# Altium footprint library module.PcbLib: 3 footprints
Each footprint in its own frame and in the unit in brackets; x right, y up, seen from the top. Pads: shape width x height; smd on the part's side, far side on the other; paste and mask are expansions set on the pad; w line width, h text height; cw(c..) or ccw(c..) is an arc to the next point about the centre after c.
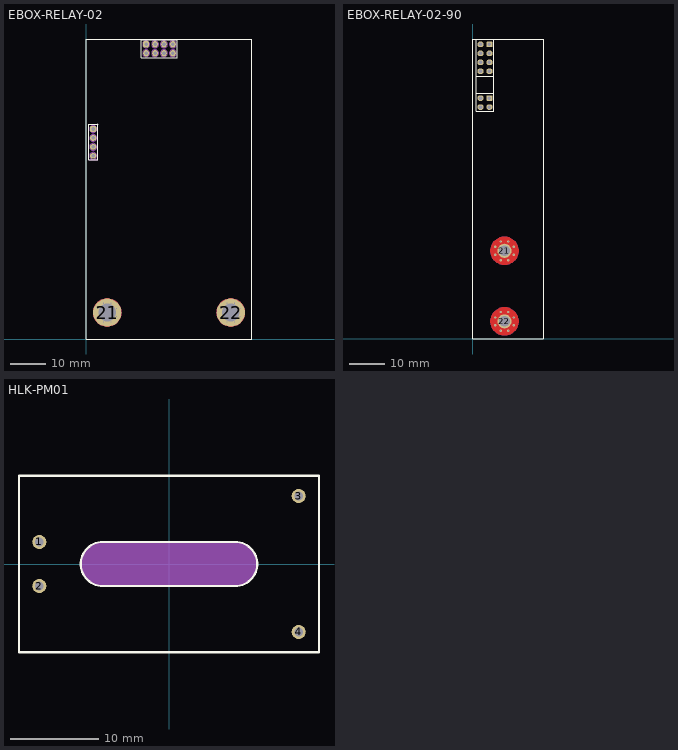
[diagram p0: the footprints below, top view; thin cyan lines are the x and y axes]

## EBOX-RELAY-02 [mm]
pads (14):
  rrect50% 1.6x1.8 hole 1: 1(17,83.5)
  oval 1.6x1.8 hole 1: 2(17,80.96) 3(19.54,83.5) 4(19.54,80.96) 5(22.08,83.5) 6(22.08,80.96) 7(24.62,83.5) 8(24.62,80.96)
  rrect50% 1.8x1.6 hole 1: 11(2,59.5)
  oval 1.8x1.6 hole 1: 12(2,56.96) 13(2,54.42) 14(2,51.88)
  round 8 hole 5: 21(6,7.5) 22(41,7.5)
via 7.1,4.85 diameter 0.66 hole 0.33
via 3.35,6.4 diameter 0.66 hole 0.33
via 4.9,10.15 diameter 0.66 hole 0.33
via 8.65,8.6 diameter 0.66 hole 0.33
via 3.35,8.6 diameter 0.66 hole 0.33
via 7.1,10.15 diameter 0.66 hole 0.33
via 8.65,6.4 diameter 0.66 hole 0.33
via 4.9,4.85 diameter 0.66 hole 0.33
via 42.1,4.85 diameter 0.66 hole 0.33
via 38.35,6.4 diameter 0.66 hole 0.33
via 39.9,10.15 diameter 0.66 hole 0.33
via 43.65,8.6 diameter 0.66 hole 0.33
via 38.35,8.6 diameter 0.66 hole 0.33
via 42.1,10.15 diameter 0.66 hole 0.33
via 43.65,6.4 diameter 0.66 hole 0.33
via 39.9,4.85 diameter 0.66 hole 0.33
Top Layer:
  region: 3.75,7.6 3.775,7.825 3.825,8.075 3.9,8.3 3.975,8.475 4.05,8.625 4.125,8.75 4.225,8.875 4.325,9 3.4,9.925 3.225,9.725 3.075,9.525 2.95,9.325 2.825,9.1 2.725,8.875 2.65,8.675 2.575,8.45 2.525,8.225 2.5,8.1 2.475,7.95 2.45,7.6
  region: 3.75,7.4 3.775,7.175 3.825,6.925 3.9,6.7 3.975,6.525 4.05,6.375 4.125,6.25 4.225,6.125 4.325,6 3.4,5.075 3.225,5.275 3.075,5.475 2.95,5.675 2.825,5.9 2.725,6.125 2.65,6.325 2.575,6.55 2.525,6.775 2.5,6.9 2.475,7.05 2.45,7.4
  region: 5.9,9.75 5.675,9.725 5.425,9.675 5.2,9.6 5.025,9.525 4.875,9.45 4.75,9.375 4.625,9.275 4.5,9.175 3.575,10.1 3.775,10.275 3.975,10.425 4.175,10.55 4.4,10.675 4.625,10.775 4.825,10.85 5.05,10.925 5.275,10.975 5.4,11 5.55,11.025 5.9,11.05
  region: 6.1,9.75 6.325,9.725 6.575,9.675 6.8,9.6 6.975,9.525 7.125,9.45 7.25,9.375 7.375,9.275 7.5,9.175 8.425,10.1 8.225,10.275 8.025,10.425 7.825,10.55 7.6,10.675 7.375,10.775 7.175,10.85 6.95,10.925 6.725,10.975 6.6,11 6.45,11.025 6.1,11.05
  region: 8.25,7.4 8.225,7.175 8.175,6.925 8.1,6.7 8.025,6.525 7.95,6.375 7.875,6.25 7.775,6.125 7.675,6 8.6,5.075 8.775,5.275 8.925,5.475 9.05,5.675 9.175,5.9 9.275,6.125 9.35,6.325 9.425,6.55 9.475,6.775 9.5,6.9 9.525,7.05 9.55,7.4
  region: 8.25,7.6 8.225,7.825 8.175,8.075 8.1,8.3 8.025,8.475 7.95,8.625 7.875,8.75 7.775,8.875 7.675,9 8.6,9.925 8.775,9.725 8.925,9.525 9.05,9.325 9.175,9.1 9.275,8.875 9.35,8.675 9.425,8.45 9.475,8.225 9.5,8.1 9.525,7.95 9.55,7.6
  region: 6.1,5.25 6.325,5.275 6.575,5.325 6.8,5.4 6.975,5.475 7.125,5.55 7.25,5.625 7.375,5.725 7.5,5.825 8.425,4.9 8.225,4.725 8.025,4.575 7.825,4.45 7.6,4.325 7.375,4.225 7.175,4.15 6.95,4.075 6.725,4.025 6.6,4 6.45,3.975 6.1,3.95
  region: 5.9,5.25 5.675,5.275 5.425,5.325 5.2,5.4 5.025,5.475 4.875,5.55 4.75,5.625 4.625,5.725 4.5,5.825 3.575,4.9 3.775,4.725 3.975,4.575 4.175,4.45 4.4,4.325 4.625,4.225 4.825,4.15 5.05,4.075 5.275,4.025 5.4,4 5.55,3.975 5.9,3.95
  pour cut-out: 2,7.5 2,7.762 2.068,8.282 2.204,8.789 2.405,9.273 2.667,9.727 2.986,10.143 3.357,10.514 3.773,10.833 4.227,11.095 4.711,11.296 5.218,11.431 5.738,11.5 6,11.5 6.262,11.5 6.782,11.432 7.288,11.296 7.773,11.095 8.227,10.833 8.643,10.514 9.014,10.143 9.333,9.727 9.595,9.273 9.796,8.788 9.932,8.282 10,7.762 10,7.5 10,7.238 9.932,6.718 9.796,6.211 9.595,5.727 9.333,5.273 9.014,4.857 8.643,4.486 8.227,4.167 7.773,3.905 7.289,3.704 6.782,3.568 6.262,3.5 6,3.5 5.738,3.5 5.218,3.568 4.712,3.704 4.227,3.905 3.773,4.167 3.357,4.486 2.986,4.857 2.667,5.273 2.405,5.727 2.204,6.211 2.068,6.718 2,7.238
  region: 38.75,7.6 38.775,7.825 38.825,8.075 38.9,8.3 38.975,8.475 39.05,8.625 39.125,8.75 39.225,8.875 39.325,9 38.4,9.925 38.225,9.725 38.075,9.525 37.95,9.325 37.825,9.1 37.725,8.875 37.65,8.675 37.575,8.45 37.525,8.225 37.5,8.1 37.475,7.95 37.45,7.6
  region: 38.75,7.4 38.775,7.175 38.825,6.925 38.9,6.7 38.975,6.525 39.05,6.375 39.125,6.25 39.225,6.125 39.325,6 38.4,5.075 38.225,5.275 38.075,5.475 37.95,5.675 37.825,5.9 37.725,6.125 37.65,6.325 37.575,6.55 37.525,6.775 37.5,6.9 37.475,7.05 37.45,7.4
  region: 40.9,9.75 40.675,9.725 40.425,9.675 40.2,9.6 40.025,9.525 39.875,9.45 39.75,9.375 39.625,9.275 39.5,9.175 38.575,10.1 38.775,10.275 38.975,10.425 39.175,10.55 39.4,10.675 39.625,10.775 39.825,10.85 40.05,10.925 40.275,10.975 40.4,11 40.55,11.025 40.9,11.05
  region: 41.1,9.75 41.325,9.725 41.575,9.675 41.8,9.6 41.975,9.525 42.125,9.45 42.25,9.375 42.375,9.275 42.5,9.175 43.425,10.1 43.225,10.275 43.025,10.425 42.825,10.55 42.6,10.675 42.375,10.775 42.175,10.85 41.95,10.925 41.725,10.975 41.6,11 41.45,11.025 41.1,11.05
  region: 43.25,7.4 43.225,7.175 43.175,6.925 43.1,6.7 43.025,6.525 42.95,6.375 42.875,6.25 42.775,6.125 42.675,6 43.6,5.075 43.775,5.275 43.925,5.475 44.05,5.675 44.175,5.9 44.275,6.125 44.35,6.325 44.425,6.55 44.475,6.775 44.5,6.9 44.525,7.05 44.55,7.4
  region: 43.25,7.6 43.225,7.825 43.175,8.075 43.1,8.3 43.025,8.475 42.95,8.625 42.875,8.75 42.775,8.875 42.675,9 43.6,9.925 43.775,9.725 43.925,9.525 44.05,9.325 44.175,9.1 44.275,8.875 44.35,8.675 44.425,8.45 44.475,8.225 44.5,8.1 44.525,7.95 44.55,7.6
  region: 41.1,5.25 41.325,5.275 41.575,5.325 41.8,5.4 41.975,5.475 42.125,5.55 42.25,5.625 42.375,5.725 42.5,5.825 43.425,4.9 43.225,4.725 43.025,4.575 42.825,4.45 42.6,4.325 42.375,4.225 42.175,4.15 41.95,4.075 41.725,4.025 41.6,4 41.45,3.975 41.1,3.95
  region: 40.9,5.25 40.675,5.275 40.425,5.325 40.2,5.4 40.025,5.475 39.875,5.55 39.75,5.625 39.625,5.725 39.5,5.825 38.575,4.9 38.775,4.725 38.975,4.575 39.175,4.45 39.4,4.325 39.625,4.225 39.825,4.15 40.05,4.075 40.275,4.025 40.4,4 40.55,3.975 40.9,3.95
  pour cut-out: 37,7.5 37,7.762 37.068,8.282 37.204,8.789 37.405,9.273 37.667,9.727 37.986,10.143 38.357,10.514 38.773,10.833 39.227,11.095 39.711,11.296 40.218,11.431 40.738,11.5 41,11.5 41.262,11.5 41.782,11.432 42.288,11.296 42.773,11.095 43.227,10.833 43.643,10.514 44.014,10.143 44.333,9.727 44.595,9.273 44.796,8.788 44.932,8.282 45,7.762 45,7.5 45,7.238 44.932,6.718 44.796,6.211 44.595,5.727 44.333,5.273 44.014,4.857 43.643,4.486 43.227,4.167 42.773,3.905 42.289,3.704 41.782,3.568 41.262,3.5 41,3.5 40.738,3.5 40.218,3.568 39.712,3.704 39.227,3.905 38.773,4.167 38.357,4.486 37.986,4.857 37.667,5.273 37.405,5.727 37.204,6.211 37.068,6.718 37,7.238
Bottom Layer:
  pour cut-out: 2,7.5 2,7.762 2.068,8.282 2.204,8.789 2.405,9.273 2.667,9.727 2.986,10.143 3.357,10.514 3.773,10.833 4.227,11.095 4.711,11.296 5.218,11.431 5.738,11.5 6,11.5 6.262,11.5 6.782,11.432 7.288,11.296 7.773,11.095 8.227,10.833 8.643,10.514 9.014,10.143 9.333,9.727 9.595,9.273 9.796,8.788 9.932,8.282 10,7.762 10,7.5 10,7.238 9.932,6.718 9.796,6.211 9.595,5.727 9.333,5.273 9.014,4.857 8.643,4.486 8.227,4.167 7.773,3.905 7.289,3.704 6.782,3.568 6.262,3.5 6,3.5 5.738,3.5 5.218,3.568 4.712,3.704 4.227,3.905 3.773,4.167 3.357,4.486 2.986,4.857 2.667,5.273 2.405,5.727 2.204,6.211 2.068,6.718 2,7.238
  pour cut-out: 37,7.5 37,7.762 37.068,8.282 37.204,8.789 37.405,9.273 37.667,9.727 37.986,10.143 38.357,10.514 38.773,10.833 39.227,11.095 39.711,11.296 40.218,11.431 40.738,11.5 41,11.5 41.262,11.5 41.782,11.432 42.288,11.296 42.773,11.095 43.227,10.833 43.643,10.514 44.014,10.143 44.333,9.727 44.595,9.273 44.796,8.788 44.932,8.282 45,7.762 45,7.5 45,7.238 44.932,6.718 44.796,6.211 44.595,5.727 44.333,5.273 44.014,4.857 43.643,4.486 43.227,4.167 42.773,3.905 42.289,3.704 41.782,3.568 41.262,3.5 41,3.5 40.738,3.5 40.218,3.568 39.712,3.704 39.227,3.905 38.773,4.167 38.357,4.486 37.986,4.857 37.667,5.273 37.405,5.727 37.204,6.211 37.068,6.718 37,7.238
Top Overlay:
  lines w0.2: 0,0 0,85 47,85 47,0 0,0 ; 15.603,79.69 25.81,79.69 25.81,84.77 15.603,84.77 15.603,79.69
  lines w0.203: 3.397,61.024 3.27,60.897 ; 15.476,84.897 15.603,84.77 ; 3.27,60.897 0.73,60.897 0.73,50.737 3.27,50.737 3.27,60.897
Bottom Overlay:
  lines w0.203: 15.603,79.69 15.603,84.77 25.763,84.77 25.763,79.69 15.603,79.69
Top Solder:
  region: 9.6,7.483 9.6,7.248 9.539,6.783 9.417,6.329 9.237,5.895 9.003,5.488 8.717,5.116 8.385,4.783 8.012,4.497 7.605,4.263 7.171,4.083 6.717,3.961 6.252,3.9 6.017,3.9 5.78,3.9 5.31,3.962 4.852,4.084 4.414,4.266 4.003,4.503 3.627,4.791 3.292,5.126 3.003,5.502 2.766,5.913 2.585,6.351 2.462,6.809 2.4,7.279 2.4,7.516 2.4,7.752 2.462,8.219 2.584,8.674 2.765,9.109 3.001,9.517 3.289,9.89 3.623,10.222 3.997,10.508 4.406,10.743 4.842,10.921 5.298,11.042 5.765,11.101 6.001,11.1 6.237,11.099 6.706,11.035 7.162,10.911 7.598,10.728 8.006,10.491 8.38,10.202 8.714,9.867 9.001,9.491 9.236,9.082 9.417,8.645 9.539,8.188 9.6,7.719
  region: 44.6,7.483 44.6,7.248 44.539,6.783 44.417,6.329 44.237,5.895 44.003,5.488 43.717,5.116 43.385,4.783 43.012,4.497 42.605,4.263 42.171,4.083 41.717,3.961 41.252,3.9 41.017,3.9 40.78,3.9 40.31,3.962 39.852,4.084 39.414,4.266 39.003,4.503 38.627,4.791 38.292,5.126 38.003,5.502 37.766,5.913 37.585,6.351 37.462,6.809 37.4,7.279 37.4,7.516 37.4,7.752 37.462,8.219 37.584,8.674 37.765,9.109 38.001,9.517 38.289,9.89 38.623,10.222 38.997,10.508 39.406,10.743 39.842,10.921 40.298,11.042 40.765,11.101 41.001,11.1 41.237,11.099 41.706,11.035 42.162,10.911 42.598,10.728 43.006,10.491 43.38,10.202 43.714,9.867 44.001,9.491 44.236,9.082 44.417,8.645 44.539,8.188 44.6,7.719
Mechanical 1:
  circle w0.254: c2,51.88 r1
  circle w0.254: c2,54.42 r1
  circle w0.254: c2,56.96 r1
  circle w0.254: c2,59.5 r1
  circle w0.254: c6,7.5 r2
  circle w0.254: c41,7.5 r2
  circle w0.254: c24.62,83.5 r1
  circle w0.254: c22.08,83.5 r1
  circle w0.254: c19.54,83.5 r1
  circle w0.254: c19.54,80.96 r1
  circle w0.254: c22.08,80.96 r1
  circle w0.254: c24.62,80.96 r1
  circle w0.254: c17,80.96 r1
  circle w0.254: c17,83.5 r1
  lines w0.203: 3.397,61.024 3.27,60.897 ; 3.27,60.897 3.27,50.737 0.73,50.737 0.73,60.897 3.27,60.897
3D body: height 0, standoff -6, extent 4.5,6 7.5,9
3D body: height 0, standoff -6, extent 39.5,6 42.5,9
3D body: height 8, standoff 0, extent 0.73,50.737 3.27,60.897
3D body: height 11, standoff 1, extent 38.085,4.951 43.915,10.049
3D body: height 11, standoff 1, extent 3.085,4.951 8.915,10.049
3D body: height 1, standoff 0, extent 37,3.5 45,11.5
3D body: height 1, standoff 0, extent 2,3.5 10,11.5
3D body: height 8, standoff 0, extent 15.81,79.73 25.81,84.73
3D body "eBox_relay_2.step": height 38.6, standoff 2.03, extent 0,-0.25 47,85

## EBOX-RELAY-02-90 [mm]
pads (14):
  rrect50% 1.8x1.6 hole 1: 1(4.75,83.5) 11(4.75,68.26)
  oval 1.8x1.6 hole 1: 2(2.21,83.5) 3(4.75,80.96) 4(2.21,80.96) 5(4.75,78.42) 6(2.21,78.42) 7(4.75,75.88) 8(2.21,75.88) 12(4.75,65.72) 13(2.21,68.26) 14(2.21,65.72)
  round 4 / inner round 5.5 / far side round 7 hole 3: 21(9,25) 22(9,5)
via 7.9,22.35 diameter 0.66 hole 0.33
via 11.65,23.9 diameter 0.66 hole 0.33
via 10.1,27.65 diameter 0.66 hole 0.33
via 6.35,26.1 diameter 0.66 hole 0.33
via 11.65,26.1 diameter 0.66 hole 0.33
via 7.9,27.65 diameter 0.66 hole 0.33
via 6.35,23.9 diameter 0.66 hole 0.33
via 10.1,22.35 diameter 0.66 hole 0.33
via 7.9,2.35 diameter 0.66 hole 0.33
via 11.65,3.9 diameter 0.66 hole 0.33
via 10.1,7.65 diameter 0.66 hole 0.33
via 6.35,6.1 diameter 0.66 hole 0.33
via 11.65,6.1 diameter 0.66 hole 0.33
via 7.9,7.65 diameter 0.66 hole 0.33
via 6.35,3.9 diameter 0.66 hole 0.33
via 10.1,2.35 diameter 0.66 hole 0.33
Top Layer:
  pour cut-out: 5,25 5,25.262 5.068,25.782 5.204,26.289 5.405,26.773 5.667,27.227 5.986,27.643 6.357,28.014 6.773,28.333 7.227,28.595 7.711,28.796 8.218,28.932 8.738,29 9,29 9.262,29 9.782,28.932 10.288,28.796 10.773,28.595 11.227,28.333 11.643,28.014 12.014,27.643 12.333,27.227 12.595,26.773 12.796,26.288 12.931,25.782 13,25.262 13,25 13,24.738 12.931,24.218 12.796,23.711 12.595,23.227 12.333,22.773 12.014,22.357 11.643,21.986 11.227,21.667 10.773,21.405 10.288,21.204 9.782,21.068 9.262,21 9,21 8.738,21 8.218,21.068 7.711,21.204 7.227,21.405 6.773,21.667 6.357,21.986 5.986,22.357 5.667,22.773 5.405,23.227 5.204,23.712 5.068,24.218 5,24.738
  region: 8.9,22.75 8.675,22.775 8.425,22.825 8.2,22.9 8.025,22.975 7.875,23.05 7.75,23.125 7.625,23.225 7.5,23.325 6.575,22.4 6.775,22.225 6.975,22.075 7.175,21.95 7.4,21.825 7.625,21.725 7.825,21.65 8.05,21.575 8.275,21.525 8.4,21.5 8.55,21.475 8.9,21.45
  region: 9.1,22.75 9.325,22.775 9.575,22.825 9.8,22.9 9.975,22.975 10.125,23.05 10.25,23.125 10.375,23.225 10.5,23.325 11.425,22.4 11.225,22.225 11.025,22.075 10.825,21.95 10.6,21.825 10.375,21.725 10.175,21.65 9.95,21.575 9.725,21.525 9.6,21.5 9.45,21.475 9.1,21.45
  region: 11.25,25.1 11.225,25.325 11.175,25.575 11.1,25.8 11.025,25.975 10.95,26.125 10.875,26.25 10.775,26.375 10.675,26.5 11.6,27.425 11.775,27.225 11.925,27.025 12.05,26.825 12.175,26.6 12.275,26.375 12.35,26.175 12.425,25.95 12.475,25.725 12.5,25.6 12.525,25.45 12.55,25.1
  region: 11.25,24.9 11.225,24.675 11.175,24.425 11.1,24.2 11.025,24.025 10.95,23.875 10.875,23.75 10.775,23.625 10.675,23.5 11.6,22.575 11.775,22.775 11.925,22.975 12.05,23.175 12.175,23.4 12.275,23.625 12.35,23.825 12.425,24.05 12.475,24.275 12.5,24.4 12.525,24.55 12.55,24.9
  region: 9.1,27.25 9.325,27.225 9.575,27.175 9.8,27.1 9.975,27.025 10.125,26.95 10.25,26.875 10.375,26.775 10.5,26.675 11.425,27.6 11.225,27.775 11.025,27.925 10.825,28.05 10.6,28.175 10.375,28.275 10.175,28.35 9.95,28.425 9.725,28.475 9.6,28.5 9.45,28.525 9.1,28.55
  region: 8.9,27.25 8.675,27.225 8.425,27.175 8.2,27.1 8.025,27.025 7.875,26.95 7.75,26.875 7.625,26.775 7.5,26.675 6.575,27.6 6.775,27.775 6.975,27.925 7.175,28.05 7.4,28.175 7.625,28.275 7.825,28.35 8.05,28.425 8.275,28.475 8.4,28.5 8.55,28.525 8.9,28.55
  region: 6.75,24.9 6.775,24.675 6.825,24.425 6.9,24.2 6.975,24.025 7.05,23.875 7.125,23.75 7.225,23.625 7.325,23.5 6.4,22.575 6.225,22.775 6.075,22.975 5.95,23.175 5.825,23.4 5.725,23.625 5.65,23.825 5.575,24.05 5.525,24.275 5.5,24.4 5.475,24.55 5.45,24.9
  region: 6.75,25.1 6.775,25.325 6.825,25.575 6.9,25.8 6.975,25.975 7.05,26.125 7.125,26.25 7.225,26.375 7.325,26.5 6.4,27.425 6.225,27.225 6.075,27.025 5.95,26.825 5.825,26.6 5.725,26.375 5.65,26.175 5.575,25.95 5.525,25.725 5.5,25.6 5.475,25.45 5.45,25.1
  pour cut-out: 5,5 5,5.262 5.068,5.782 5.204,6.289 5.405,6.773 5.667,7.227 5.986,7.643 6.357,8.014 6.773,8.333 7.227,8.595 7.711,8.796 8.218,8.932 8.738,9 9,9 9.262,9 9.782,8.932 10.288,8.796 10.773,8.595 11.227,8.333 11.643,8.014 12.014,7.643 12.333,7.227 12.595,6.773 12.796,6.288 12.931,5.782 13,5.262 13,5 13,4.738 12.931,4.218 12.796,3.711 12.595,3.227 12.333,2.773 12.014,2.357 11.643,1.986 11.227,1.667 10.773,1.405 10.288,1.204 9.782,1.068 9.262,1 9,1 8.738,1 8.218,1.068 7.711,1.204 7.227,1.405 6.773,1.667 6.357,1.986 5.986,2.357 5.667,2.773 5.405,3.227 5.204,3.712 5.068,4.218 5,4.738
  region: 8.9,2.75 8.675,2.775 8.425,2.825 8.2,2.9 8.025,2.975 7.875,3.05 7.75,3.125 7.625,3.225 7.5,3.325 6.575,2.4 6.775,2.225 6.975,2.075 7.175,1.95 7.4,1.825 7.625,1.725 7.825,1.65 8.05,1.575 8.275,1.525 8.4,1.5 8.55,1.475 8.9,1.45
  region: 9.1,2.75 9.325,2.775 9.575,2.825 9.8,2.9 9.975,2.975 10.125,3.05 10.25,3.125 10.375,3.225 10.5,3.325 11.425,2.4 11.225,2.225 11.025,2.075 10.825,1.95 10.6,1.825 10.375,1.725 10.175,1.65 9.95,1.575 9.725,1.525 9.6,1.5 9.45,1.475 9.1,1.45
  region: 11.25,5.1 11.225,5.325 11.175,5.575 11.1,5.8 11.025,5.975 10.95,6.125 10.875,6.25 10.775,6.375 10.675,6.5 11.6,7.425 11.775,7.225 11.925,7.025 12.05,6.825 12.175,6.6 12.275,6.375 12.35,6.175 12.425,5.95 12.475,5.725 12.5,5.6 12.525,5.45 12.55,5.1
  region: 11.25,4.9 11.225,4.675 11.175,4.425 11.1,4.2 11.025,4.025 10.95,3.875 10.875,3.75 10.775,3.625 10.675,3.5 11.6,2.575 11.775,2.775 11.925,2.975 12.05,3.175 12.175,3.4 12.275,3.625 12.35,3.825 12.425,4.05 12.475,4.275 12.5,4.4 12.525,4.55 12.55,4.9
  region: 9.1,7.25 9.325,7.225 9.575,7.175 9.8,7.1 9.975,7.025 10.125,6.95 10.25,6.875 10.375,6.775 10.5,6.675 11.425,7.6 11.225,7.775 11.025,7.925 10.825,8.05 10.6,8.175 10.375,8.275 10.175,8.35 9.95,8.425 9.725,8.475 9.6,8.5 9.45,8.525 9.1,8.55
  region: 8.9,7.25 8.675,7.225 8.425,7.175 8.2,7.1 8.025,7.025 7.875,6.95 7.75,6.875 7.625,6.775 7.5,6.675 6.575,7.6 6.775,7.775 6.975,7.925 7.175,8.05 7.4,8.175 7.625,8.275 7.825,8.35 8.05,8.425 8.275,8.475 8.4,8.5 8.55,8.525 8.9,8.55
  region: 6.75,4.9 6.775,4.675 6.825,4.425 6.9,4.2 6.975,4.025 7.05,3.875 7.125,3.75 7.225,3.625 7.325,3.5 6.4,2.575 6.225,2.775 6.075,2.975 5.95,3.175 5.825,3.4 5.725,3.625 5.65,3.825 5.575,4.05 5.525,4.275 5.5,4.4 5.475,4.55 5.45,4.9
  region: 6.75,5.1 6.775,5.325 6.825,5.575 6.9,5.8 6.975,5.975 7.05,6.125 7.125,6.25 7.225,6.375 7.325,6.5 6.4,7.425 6.225,7.225 6.075,7.025 5.95,6.825 5.825,6.6 5.725,6.375 5.65,6.175 5.575,5.95 5.525,5.725 5.5,5.6 5.475,5.45 5.45,5.1
Bottom Layer:
  pour cut-out: 5,25 5,25.262 5.068,25.782 5.204,26.289 5.405,26.773 5.667,27.227 5.986,27.643 6.357,28.014 6.773,28.333 7.227,28.595 7.711,28.796 8.218,28.932 8.738,29 9,29 9.262,29 9.782,28.932 10.288,28.796 10.773,28.595 11.227,28.333 11.643,28.014 12.014,27.643 12.333,27.227 12.595,26.773 12.796,26.288 12.931,25.782 13,25.262 13,25 13,24.738 12.931,24.218 12.796,23.711 12.595,23.227 12.333,22.773 12.014,22.357 11.643,21.986 11.227,21.667 10.773,21.405 10.288,21.204 9.782,21.068 9.262,21 9,21 8.738,21 8.218,21.068 7.711,21.204 7.227,21.405 6.773,21.667 6.357,21.986 5.986,22.357 5.667,22.773 5.405,23.227 5.204,23.712 5.068,24.218 5,24.738
  pour cut-out: 5,5 5,5.262 5.068,5.782 5.204,6.289 5.405,6.773 5.667,7.227 5.986,7.643 6.357,8.014 6.773,8.333 7.227,8.595 7.711,8.796 8.218,8.932 8.738,9 9,9 9.262,9 9.782,8.932 10.288,8.796 10.773,8.595 11.227,8.333 11.643,8.014 12.014,7.643 12.333,7.227 12.595,6.773 12.796,6.288 12.931,5.782 13,5.262 13,5 13,4.738 12.931,4.218 12.796,3.711 12.595,3.227 12.333,2.773 12.014,2.357 11.643,1.986 11.227,1.667 10.773,1.405 10.288,1.204 9.782,1.068 9.262,1 9,1 8.738,1 8.218,1.068 7.711,1.204 7.227,1.405 6.773,1.667 6.357,1.986 5.986,2.357 5.667,2.773 5.405,3.227 5.204,3.712 5.068,4.218 5,4.738
Top Overlay:
  lines w0.2: 0.94,69.61 6.02,69.61 ; 0.94,74.53 6.02,74.53 ; 0.94,74.69 0.94,84.897 6.02,84.897 6.02,74.69 ; 0,0 20,0 20,85 0,85 0,0
  lines w0.203: 0.94,74.737 0.94,64.577 3.48,64.577 6.02,64.577 6.02,74.737 ; 6.02,84.897 6.147,85.024
Bottom Overlay:
  lines w0.203: 0.94,74.737 0.94,84.897 6.02,84.897 6.02,74.737
Top Solder:
  region: 12.6,24.983 12.6,24.748 12.539,24.283 12.417,23.829 12.237,23.395 12.002,22.988 11.717,22.616 11.384,22.283 11.012,21.998 10.605,21.763 10.171,21.583 9.717,21.461 9.252,21.4 9.017,21.4 8.78,21.4 8.31,21.462 7.852,21.584 7.414,21.766 7.003,22.003 6.627,22.291 6.292,22.626 6.003,23.003 5.766,23.413 5.585,23.851 5.462,24.309 5.4,24.779 5.4,25.016 5.4,25.252 5.462,25.719 5.584,26.174 5.765,26.609 6.001,27.017 6.289,27.39 6.623,27.722 6.997,28.008 7.406,28.243 7.842,28.421 8.298,28.542 8.765,28.601 9.001,28.6 9.237,28.599 9.705,28.535 10.161,28.411 10.597,28.228 11.006,27.991 11.38,27.702 11.714,27.367 12,26.991 12.236,26.582 12.416,26.145 12.538,25.688 12.6,25.219
  region: 12.6,4.983 12.6,4.748 12.539,4.283 12.417,3.829 12.237,3.395 12.003,2.988 11.717,2.616 11.384,2.283 11.012,1.998 10.605,1.763 10.171,1.583 9.717,1.461 9.252,1.4 9.017,1.4 8.78,1.4 8.31,1.462 7.852,1.584 7.414,1.766 7.003,2.003 6.627,2.291 6.292,2.626 6.003,3.003 5.766,3.413 5.585,3.851 5.462,4.309 5.4,4.779 5.4,5.016 5.4,5.252 5.462,5.719 5.584,6.174 5.765,6.609 6.001,7.017 6.289,7.39 6.623,7.722 6.997,8.008 7.406,8.243 7.842,8.421 8.298,8.542 8.765,8.601 9.001,8.6 9.237,8.599 9.705,8.535 10.162,8.411 10.598,8.228 11.006,7.991 11.38,7.702 11.714,7.367 12.001,6.991 12.236,6.582 12.417,6.145 12.539,5.688 12.6,5.219
Mechanical 1:
  circle w0.254: c9,25 r2
  circle w0.254: c9,5 r2
3D body "HEX-MF-M3-15-6.step": height 15, standoff -6, extent 6.325,2.65 11.675,7.35
3D body "HEX-MF-M3-15-6.step": height 15, standoff -6, extent 6.325,22.65 11.675,27.35
3D body "eBox_relay_2_90.step": height 66, standoff 1.84, extent -23.15,-0.25 13.34,85
3D body: height 8, standoff 0, extent 0.98,74.69 5.98,84.69
3D body: height 8, standoff 0, extent 0.94,64.577 3.48,69.5
3D body: height 8, standoff 0, extent 3.48,64.577 6.02,69.5

## HLK-PM01 [mm]
pads (4):
  round 1.6 hole 1: 1(-14.7,2.5) 2(-14.7,-2.5) 3(14.7,7.7) 4(14.7,-7.7)
Top Overlay:
  lines w0.254: -17,-10 -17,10 17,10 17,-10 -17,-10 ; -7.5,-2.5 cw(c-7.5,0) -7.5,2.5 7.5,2.5 cw(c7.5,0) 7.5,-2.5 -7.5,-2.5
Mechanical 1:
  region: -7.5,2.5 7.5,2.5 7.746,2.5 8.229,2.404 8.684,2.215 9.094,1.942 9.442,1.594 9.715,1.184 9.904,0.729 10,0.246 10,0 10,-0.246 9.904,-0.729 9.715,-1.184 9.442,-1.594 9.094,-1.942 8.684,-2.215 8.229,-2.404 7.746,-2.5 7.5,-2.5 -7.5,-2.5 -7.746,-2.5 -8.229,-2.404 -8.684,-2.215 -9.094,-1.942 -9.442,-1.594 -9.715,-1.184 -9.904,-0.729 -10,-0.246 -10,0 -10,0.246 -9.904,0.729 -9.715,1.184 -9.442,1.594 -9.094,1.942 -8.684,2.215 -8.229,2.404 -7.746,2.5
  text "AC" at -13,2 h1.8
  text "AC" at -13,-3 h1.8
  text "-Vo" at 10.5,7 h1.8
  text "+Vo" at 10.5,-8.5 h1.8
3D body "HLK-PM01.step": height 15.1, standoff -5, extent -17,-10.1 17,10.1